# Altium footprint library Whiskeypedia_Components.PcbLib: 23 footprints (part 2 of 2)
Each footprint in its own frame and in the unit in brackets; x right, y up, seen from the top. Pads: shape width x height; smd on the part's side, far side on the other; paste and mask are expansions set on the pad; w line width, h text height; cw(c..) or ccw(c..) is an arc to the next point about the centre after c.
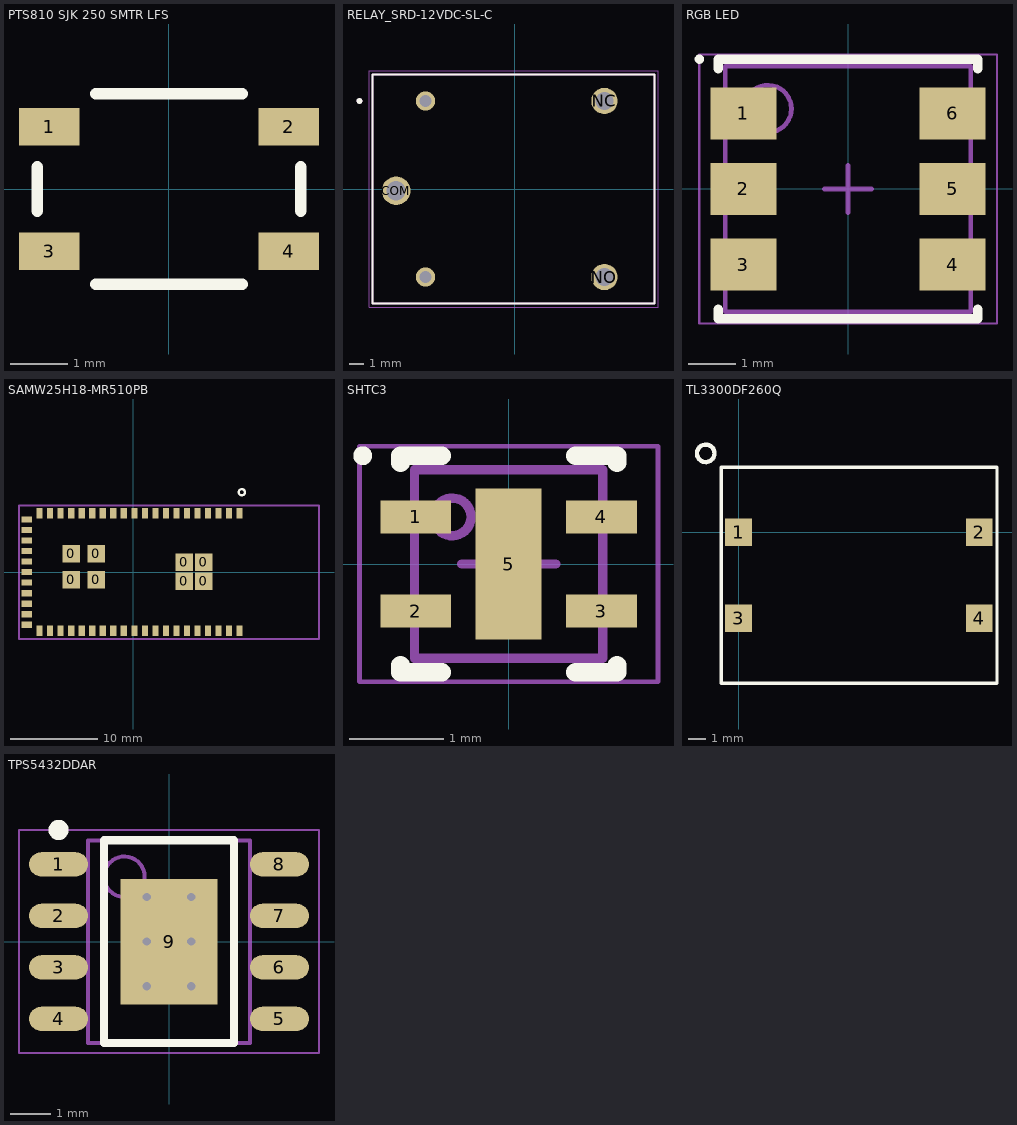
[diagram p1: the footprints below, top view; thin cyan lines are the x and y axes]

## PTS810 SJK 250 SMTR LFS [mm] "SWITCH TACTILE SPST-NO 0.05A 16V"
pads (4):
  rect 1.05x0.65 smd: 1(-2.075,1.075) 2(2.075,1.075) 3(-2.075,-1.075) 4(2.075,-1.075)
Top Overlay:
  lines w0.203: -2.286,-0.381 -2.286,0.381 ; -1.27,-1.651 1.27,-1.651 ; -1.27,1.651 1.27,1.651 ; 2.286,-0.381 2.286,0.381
3D body "PTS810 CK Switch.STEP": height 2.5, standoff 0, extent -2.3,-1.6 2.3,1.6

## RELAY_SRD-12VDC-SL-C [mm]
pads (5):
  round 1.308 hole 0.8: COIL1(-6.1,6) COIL2(-6.1,-6)
  round 1.95 hole 1.3: COM(-8.1,-0.12)
  round 1.8 hole 1.2: NC(6.1,6) NO(6.1,-6)
Top Overlay:
  circle w0.2: c-10.6,6 r0.1
  lines w0.127: -9.7,-7.8 9.5,-7.8 9.5,7.8 -9.7,7.8 -9.7,-7.8
Mechanical 13:
  circle w0.2: c-10.6,6 r0.1
  lines w0.127: -9.7,-7.8 9.5,-7.8 9.5,7.8 -9.7,7.8 -9.7,-7.8
Mechanical 15:
  lines w0.05: -9.95,-8.05 9.75,-8.05 9.75,8.05 -9.95,8.05 -9.95,-8.05
3D body "SRD-12VDC-SL-C--3DModel-STEP-1.STEP": height 15.81, standoff -2.99, extent -9.6,-7.8 9.6,7.8

## RGB LED [mm] "SON, 6-Leads, Body 5.00x5.00mm, Pitch 1.60mm, Thermal Pad 0.00x0.00mm, IPC Medium Density"
height 3
pads (6):
  rect 1.4x1.1 smd: 1(-2.215,1.6) 2(-2.215,0) 3(-2.215,-1.6) 4(2.215,-1.6) 5(2.215,0) 6(2.215,1.6)
Top Overlay:
  circle w0.1: c-3.15,2.75 r0.05
  lines w0.2: -2.75,-2.55 -2.75,-2.75 2.75,-2.75 2.75,-2.55 ; -2.75,2.55 -2.75,2.75 2.75,2.75 2.75,2.55
Mechanical 13:
  circle w0.1: c-1.7,1.7 r0.5
  lines w0.1: -2.6,-2.6 -2.6,2.6 2.6,2.6 2.6,-2.6 -2.6,-2.6
  text "'.Designator'" at -1.578,-0.543 h1.2
Mechanical 15:
  lines w0.05: -3.155,-2.85 -3.155,2.85 3.155,2.85 3.155,-2.85 -3.155,-2.85
  lines w0.1: -0.5,0 0.5,0 ; 0,-0.5 0,0.5
3D body "QBHP688.step": height 1, standoff 0, extent -2.651,-2.5 2.651,2.5

## SAMW25H18-MR510PB [mm] "RF TXRX MODULE WIFI TRACE ANT"
pads (59):
  rect 2x2 smd: 0(-7.065,-0.839) 0(-7.065,2.085) 0(-4.21,-0.839) 0(-4.21,2.085)
  rect 2x2 smd mask+0.12: 0(5.828,-1.045) 0(5.828,1.137) 0(8.046,-1.045) 0(8.046,1.137)
  rect 0.7x1.2 smd: 1(12.121,6.7) 2(10.921,6.7) 3(9.721,6.7) 4(8.521,6.7) 5(7.321,6.7) 6(6.121,6.7) 7(4.921,6.7) 8(3.721,6.7) 9(2.521,6.7) 10(1.321,6.7) 11(0.121,6.7) 12(-1.079,6.7) 13(-2.279,6.7) 14(-3.479,6.7) 15(-4.679,6.7) 16(-5.879,6.7) 17(-7.079,6.7) 18(-8.279,6.7) 19(-9.479,6.7) 20(-10.679,6.7) 32(-10.679,-6.7) 33(-9.479,-6.7) 34(-8.279,-6.7) 35(-7.079,-6.7) 36(-5.879,-6.7) 37(-4.679,-6.7) 38(-3.479,-6.7) 39(-2.279,-6.7) 40(-1.079,-6.7) 41(0.121,-6.7) 42(1.321,-6.7) 43(2.521,-6.7) 44(3.721,-6.7) 45(4.921,-6.7) 46(6.121,-6.7) 47(7.321,-6.7) 48(8.521,-6.7) 49(9.721,-6.7) 50(10.921,-6.7) 51(12.121,-6.7)
  rect 1.2x0.7 smd: 21(-12.12,6.004) 22(-12.12,4.804) 23(-12.12,3.604) 24(-12.12,2.404) 25(-12.12,1.204) 26(-12.12,0.004) 27(-12.12,-1.196) 28(-12.12,-2.396) 29(-12.12,-3.596) 30(-12.12,-4.796) 31(-12.12,-5.996)
Top Overlay:
  circle w0.254: c12.382,9.118 r0.358
Mechanical 3:
  lines w0.254: -13.031,-7.612 21.179,-7.612 21.179,7.597 -13.031,7.597 -13.031,-7.612
3D body "SAMW25.STEP": height 3.37, standoff -0.03, extent -12.885,-7.452 20.978,7.455

## SHTC3 [mm] "Temprature Sensor"
height 0.75
pads (5):
  rect 0.75x0.35 smd: 1(-0.985,0.5) 2(-0.985,-0.5) 3(0.985,-0.5) 4(0.985,0.5)
  rect 0.7x1.6 smd: 5(0,0)
Top Overlay:
  circle w0.1: c-1.55,1.15 r0.05
  lines w0.2: -1.15,-1.075 -1.15,-1.15 -0.71,-1.15 ; -1.15,1.075 -1.15,1.15 -0.71,1.15 ; 0.71,-1.15 1.15,-1.15 1.15,-1.075 ; 0.71,1.15 1.15,1.15 1.15,1.075
Mechanical 13:
  circle w0.1: c-0.6,0.5 r0.2
  lines w0.1: -1,-1 1,-1 1,1 -1,1 -1,-1
  text "'.Designator'" at -1,-0.6 h1.2
Mechanical 15:
  lines w0.05: -1.585,-1.25 1.585,-1.25 1.585,1.25 -1.585,1.25 -1.585,-1.25
  lines w0.1: -0.5,0 0.5,0 ; 0,-0.5 0,0.5
3D body "SHTC3_SEN.step": height 0.76, standoff 0, extent -1.003,-1.003 1.003,1.003

## TL3300DF260Q [mm] "SWITCH TACTILE SPST-NO 0.05A 12V"
height 4.293
pads (4):
  rect 1.55x1.6 smd: 1(0,0) 2(13.95,0) 3(0,-5) 4(13.95,-5)
Top Overlay:
  circle w0.254: c-1.905,4.572 r0.508
  lines w0.2: -1.016,-8.77 -1.016,3.77 14.986,3.77 14.986,-8.77 -1.016,-8.77
3D body "TL3300DFxxxQ.stp": height 4.3, standoff -0.3, extent -0.515,-8.509 14.485,3.491

## TPS5432DDAR [mm] "SOIC, 8-Leads, Body 4.90x3.90mm, Pitch 1.27mm, Thermal Pad 3.10x2.40mm, IPC Medium Density"
height 1.7
pads (9):
  oval 1.45x0.6 smd: 1(-2.725,1.905) 2(-2.725,0.635) 3(-2.725,-0.635) 4(-2.725,-1.905) 5(2.725,-1.905) 6(2.725,-0.635) 7(2.725,0.635) 8(2.725,1.905)
  rect 2.4x3.1 smd: 9(0,0)
via 0.55,-1.1 diameter 0.5 hole 0.2
via -0.55,-1.1 diameter 0.5 hole 0.2
via 0.55,0 diameter 0.5 hole 0.2
via -0.55,0 diameter 0.5 hole 0.2
via 0.55,1.1 diameter 0.5 hole 0.2
via -0.55,1.1 diameter 0.5 hole 0.2
Top Overlay:
  circle w0.25: c-2.725,2.755 r0.125
  lines w0.2: -1.6,-2.5 1.6,-2.5 1.6,2.5 -1.6,2.5 -1.6,-2.5
Mechanical 13:
  circle w0.1: c-1.1,1.6 r0.5
  lines w0.1: -2,-2.5 2,-2.5 2,2.5 -2,2.5 -2,-2.5
Mechanical 15:
  lines w0.05: -3.7,-2.75 3.7,-2.75 3.7,2.75 -3.7,2.75 -3.7,-2.75
  lines w0.1: -0.5,0 0.5,0 ; 0,-0.5 0,0.5
3D body "DDA0008E.stp": height 1.57, standoff 0, extent -3,-2.45 3,2.45